# Altium footprint library 7-Connectors-13.PcbLib: 44 footprints (part 1 of 5) (continued)
## 3M_N3428-5302RB [mm] "3M, 3000 Series, 20 Contacts - Pitch 2.54mm - Right Angle Four-Wall Header (Black) With Long Roll Pin Latch/Ejectors" (continued)
Mechanical 14:
  circle w0.1: c-17.018,6.375 r0.787
  circle w0.1: c17.018,6.375 r0.787
  circle w0.1: c17.336,0.533 r1.27
  circle w0.1: c-17.336,0.533 r1.27
  lines w0.1: -19.837,-2.007 -19.837,1.978 -17.336,3.422 -14.834,1.978 -14.834,-2.007 ; -18.339,14.249 -18.339,24.561 -18.186,24.649 -13.081,21.702 -13.081,18.336 -13.183,18.235 -18.339,18.235 ; -15.113,14.757 -15.113,22.875 ; -12.694,11.201 -11.424,9.002 -10.887,9.931 ; -11.119,11.201 -11.119,9.931 -9.201,9.931 -9.208,11.201 ; -2.032,5.105 2.032,5.105 ; -2.032,11.201 -2.032,3.581 2.032,3.581 2.032,11.201 ; -1.587,5.105 -1.587,11.201 ; -0.953,5.105 -0.953,11.201 ; 0.953,5.105 0.953,11.201 ; 1.587,5.105 1.587,11.201 ; 6.668,11.201 6.661,9.931 8.579,9.931 8.573,11.201 ; 14.834,-2.007 14.834,1.978 17.336,3.422 19.837,1.978 19.837,-2.007 ; 15.113,22.875 15.137,14.757 ; 18.339,14.249 18.339,24.561 18.186,24.649 13.081,21.702 13.081,18.336 13.183,18.235 18.339,18.235 ; -22.352,-2.007 -22.352,5.105 -19.024,14.249 -18.182,14.249 ccw(c-17.018,14.757) -15.748,14.757 -14.906,14.757 -14.464,12.251 ccw(c-13.213,12.471) -13.213,11.201 13.213,11.201 ccw(c13.213,12.471) 14.464,12.251 14.906,14.757 15.748,14.757 ccw(c17.018,14.757) 18.182,14.249 19.024,14.249 22.352,5.105 22.352,-2.007 -22.352,-2.007
  text "1" at -13.462,-1.7 h1.02
  text "20" at 12.69,0.889 h1.02
3D body "3M_N3428-5302RB.stp": height 8.64, standoff -3.94, extent -22.352,-2.006 22.352,24.663
3D body "3M_N3428-5302RB.stp": height 0, standoff 0, extent 0,0 0,0
3D body "3M_N3428-5302RB.stp": height 0, standoff 0, extent 18.415,-7.62 18.415,-7.62

## 3M_N3429-5202RB [mm] "3M, 3000 Series, 26 Contacts - Pitch 2.54mm - Right Angle Four-Wall Header (Black) With Short Roll Pin Latch/Ejectors"
height 8.6
pads (28):
  round 1.6 hole 0.9: 1(-15.24,-1.27) 2(-15.24,1.27) 3(-12.7,-1.27) 4(-12.7,1.27) 5(-10.16,-1.27) 6(-10.16,1.27) 7(-7.62,-1.27) 8(-7.62,1.27) 9(-5.08,-1.27) 10(-5.08,1.27) 11(-2.54,-1.27) 12(-2.54,1.27) 13(0,-1.27) 14(0,1.27) 15(2.54,-1.27) 16(2.54,1.27) 17(5.08,-1.27) 18(5.08,1.27) 19(7.62,-1.27) 20(7.62,1.27) 21(10.16,-1.27) 22(10.16,1.27) 23(12.7,-1.27) 24(12.7,1.27) 25(15.24,-1.27) 26(15.24,1.27)
  round 4.6 hole 2.8: MTG1(-21.146,0.533) MTG2(21.146,0.533)
Top Overlay:
  circle w0.3: c-15.313,-3.048 r0.15
  lines w0.2: -29.561,9.892 -26.983,14.358 ccw(c-27.071,14.409) -27.02,14.497 -29.935,16.179 -35.04,13.232 ccw(c-34.989,13.144) -35.04,13.056 -28.051,9.02 -25.74,6.266 ; -27.948,12.686 -24.192,10.517 ; -24.702,-2.009 -26.162,-2.007 -26.162,5.105 -22.834,14.249 -21.992,14.249 ccw(c-20.828,14.757) -19.558,14.756 -18.716,14.757 -18.274,12.251 ccw(c-17.023,12.471) -17.023,11.201 17.023,11.201 ccw(c17.023,12.471) 18.274,12.251 18.716,14.757 19.558,14.757 ccw(c20.828,14.757) 21.992,14.249 22.834,14.249 26.162,5.105 26.162,-2.007 24.702,-2.007 cw(c24.194,-2.007) 23.686,-2.007 ; -24.702,-2.007 ccw(c-24.194,-2.007) -23.686,-2.007 ; -22.149,14.249 -22.149,22.024 cw(c-22.047,22.024) -21.996,22.112 -16.891,19.164 -16.891,15.799 cw(c-16.993,15.799) -16.993,15.697 -22.149,15.697 ; -18.923,14.757 -18.923,15.697 ; -16.478,11.201 -15.208,9.002 -14.671,9.931 ; -14.929,11.201 -14.929,9.931 -13.011,9.931 -13.011,11.201 ; -6.858,-2.007 ccw(c-6.35,-2.007) -5.842,-2.007 ; -2.032,11.201 -2.032,3.581 2.032,3.581 2.032,11.201 ; 5.842,-2.007 ccw(c6.35,-2.007) 6.858,-2.007 ; 18.923,14.757 18.923,15.697 ; 22.149,14.249 22.149,22.024 ccw(c22.047,22.024) 21.996,22.112 16.891,19.164 16.891,15.799 ccw(c16.993,15.799) 16.993,15.697 22.149,15.697 ; 24.192,10.517 27.948,12.686 ; 25.74,6.266 28.051,9.02 35.04,13.056 ccw(c34.989,13.144) 35.04,13.232 29.935,16.179 27.02,14.497 ccw(c27.071,14.409) 26.983,14.358 29.561,9.892
  text "1" at -17.272,-1.7 h1.02
  text "26" at 16.5,0.889 h1.02
Mechanical 8:
  circle w0.05: c15.24,1.27 r0.5
  circle w0.05: c12.7,1.27 r0.5
  circle w0.05: c10.16,1.27 r0.5
  circle w0.05: c7.62,1.27 r0.5
  circle w0.05: c5.08,1.27 r0.5
  circle w0.05: c2.54,1.27 r0.5
  circle w0.05: c0,1.27 r0.5
  circle w0.05: c-2.54,1.27 r0.5
  circle w0.05: c-5.08,1.27 r0.5
  circle w0.05: c-7.62,1.27 r0.5
  circle w0.05: c-10.16,1.27 r0.5
  circle w0.05: c-12.7,1.27 r0.5
  circle w0.05: c-15.24,1.27 r0.5
  circle w0.05: c-15.24,-1.27 r0.5
  circle w0.05: c-12.7,-1.27 r0.5
  circle w0.05: c-10.16,-1.27 r0.5
  circle w0.05: c-7.62,-1.27 r0.5
  circle w0.05: c-5.08,-1.27 r0.5
  circle w0.05: c-2.54,-1.27 r0.5
  circle w0.05: c0,-1.27 r0.5
  circle w0.05: c2.54,-1.27 r0.5
  circle w0.05: c5.08,-1.27 r0.5
  circle w0.05: c7.62,-1.27 r0.5
  circle w0.05: c10.16,-1.27 r0.5
  circle w0.05: c12.7,-1.27 r0.5
  circle w0.05: c15.24,-1.27 r0.5
  circle w0.1: c21.146,0.533 r1.3
  circle w0.05: c-21.146,0.533 r1.3
  lines w0.05: -1,0 0,0 0,-1
Mechanical 14:
  lines w0.1: -29.561,9.892 -26.983,14.358 ccw(c-27.071,14.409) -27.02,14.497 -29.935,16.179 -35.04,13.232 ccw(c-34.989,13.144) -35.04,13.056 -28.051,9.02 -25.74,6.266 ; -27.948,12.686 -24.192,10.517 ; -24.702,-2.009 -26.162,-2.007 -26.162,5.105 -22.834,14.249 -21.992,14.249 ccw(c-20.828,14.757) -19.558,14.756 -18.716,14.757 -18.274,12.251 ccw(c-17.023,12.471) -17.023,11.201 17.023,11.201 ccw(c17.023,12.471) 18.274,12.251 18.716,14.757 19.558,14.757 ccw(c20.828,14.757) 21.992,14.249 22.834,14.249 26.162,5.105 26.162,-2.007 24.702,-2.007 cw(c24.194,-2.007) 23.686,-2.007 6.858,-2.007 cw(c6.35,-2.007) 5.842,-2.007 -5.842,-2.007 cw(c-6.35,-2.007) -6.858,-2.007 -23.686,-2.007 cw(c-24.194,-2.007) -24.702,-2.007 ; -23.647,-2.007 -23.647,1.978 -21.146,3.422 -18.644,1.978 -18.644,-2.007 ; -23.28,-2.007 -23.043,0.699 cw(c-21.146,0.533) -19.248,0.699 -19.011,-2.007 ; -22.149,14.249 -22.149,22.024 cw(c-22.047,22.024) -21.996,22.112 -16.891,19.164 -16.891,15.799 cw(c-16.993,15.799) -16.993,15.697 -22.149,15.697 ; -18.923,14.757 -18.923,15.697 ; -16.478,11.201 -15.208,9.002 -14.671,9.931 ; -14.929,11.201 -14.929,9.931 -13.011,9.931 -13.011,11.201 ; -2.032,11.201 -2.032,3.581 2.032,3.581 2.032,11.201 ; 18.644,-2.007 18.644,1.978 21.146,3.422 23.647,1.978 23.647,-2.007 ; 18.923,14.757 18.923,15.697 ; 19.011,-2.007 19.248,0.699 cw(c21.146,0.533) 23.043,0.699 23.28,-2.007 ; 22.149,14.249 22.149,22.024 ccw(c22.047,22.024) 21.996,22.112 16.891,19.164 16.891,15.799 ccw(c16.993,15.799) 16.993,15.697 22.149,15.697 ; 24.192,10.517 27.948,12.686 ; 25.74,6.266 28.051,9.02 35.04,13.056 ccw(c34.989,13.144) 35.04,13.232 29.935,16.179 27.02,14.497 ccw(c27.071,14.409) 26.983,14.358 29.561,9.892
  text "1" at -17.272,-1.7 h1.02
  text "26" at 16.5,0.889 h1.02
3D body "3M_N3429-5202RB.stp": height 8.64, standoff -3.94, extent -35.091,-2.513 35.091,16.181

## 3M_N3429-5302RB [mm] "3M, 3000 Series, 26 Contacts - Pitch 2.54mm - Right Angle Four-Wall Header (Black) With Long Roll Pin Latch/Ejectors"
height 8.6
pads (28):
  round 1.6 hole 0.9: 1(-15.24,-1.27) 2(-15.24,1.27) 3(-12.7,-1.27) 4(-12.7,1.27) 5(-10.16,-1.27) 6(-10.16,1.27) 7(-7.62,-1.27) 8(-7.62,1.27) 9(-5.08,-1.27) 10(-5.08,1.27) 11(-2.54,-1.27) 12(-2.54,1.27) 13(0,-1.27) 14(0,1.27) 15(2.54,-1.27) 16(2.54,1.27) 17(5.08,-1.27) 18(5.08,1.27) 19(7.62,-1.27) 20(7.62,1.27) 21(10.16,-1.27) 22(10.16,1.27) 23(12.7,-1.27) 24(12.7,1.27) 25(15.24,-1.27) 26(15.24,1.27)
  round 4.6 hole 2.8: MTG1(-21.146,0.533) MTG2(21.146,0.533)
Top Overlay:
  circle w0.3: c-15.313,-3.048 r0.15
  lines w0.2: -31.759,11.161 -29.181,15.627 ccw(c-29.269,15.677) -29.218,15.765 -32.132,17.448 -37.238,14.5 ccw(c-37.187,14.412) -37.238,14.324 -28.051,9.02 -25.74,6.266 ; -30.146,13.955 -24.192,10.517 ; -23.686,-2.007 cw(c-24.194,-2.007) -24.702,-2.007 -26.162,-2.007 -26.162,5.105 -22.834,14.249 -21.992,14.249 ccw(c-20.828,14.757) -19.558,14.756 -18.716,14.757 -18.274,12.251 ccw(c-17.023,12.471) -17.023,11.201 17.023,11.201 ccw(c17.023,12.471) 18.274,12.251 18.716,14.757 19.558,14.757 ccw(c20.828,14.757) 21.992,14.249 22.834,14.249 26.162,5.105 26.162,-2.007 24.702,-2.007 cw(c24.194,-2.007) 23.686,-2.007 ; -22.149,14.249 -22.149,24.561 cw(c-22.047,24.561) -21.996,24.649 -16.891,21.702 -16.891,18.336 cw(c-16.993,18.336) -16.993,18.235 -22.149,18.235 ; -18.923,14.757 -18.923,18.235 ; -16.478,11.201 -15.208,9.002 -14.671,9.931 ; -14.929,11.201 -14.929,9.931 -13.011,9.931 -13.011,11.201 ; -6.858,-2.007 ccw(c-6.35,-2.007) -5.842,-2.007 ; -2.032,11.201 -2.032,3.581 2.032,3.581 2.032,11.201 ; 5.842,-2.007 ccw(c6.35,-2.007) 6.858,-2.007 ; 18.923,14.757 18.923,18.235 ; 22.149,14.249 22.149,24.561 ccw(c22.047,24.561) 21.996,24.649 16.891,21.702 16.891,18.336 ccw(c16.993,18.336) 16.993,18.235 22.149,18.235 ; 24.192,10.517 30.146,13.955 ; 25.74,6.266 28.051,9.02 37.238,14.324 ccw(c37.187,14.412) 37.238,14.5 32.132,17.448 29.218,15.765 ccw(c29.269,15.677) 29.181,15.627 31.759,11.161
  text "26" at 16.5,0.889 h1.02
  text "1" at -17.272,-1.7 h1.02
Mechanical 8:
  circle w0.05: c-21.146,0.533 r1.3
  circle w0.1: c21.146,0.533 r1.3
  circle w0.05: c15.24,-1.27 r0.5
  circle w0.05: c12.7,-1.27 r0.5
  circle w0.05: c10.16,-1.27 r0.5
  circle w0.05: c7.62,-1.27 r0.5
  circle w0.05: c5.08,-1.27 r0.5
  circle w0.05: c2.54,-1.27 r0.5
  circle w0.05: c0,-1.27 r0.5
  circle w0.05: c-2.54,-1.27 r0.5
  circle w0.05: c-5.08,-1.27 r0.5
  circle w0.05: c-7.62,-1.27 r0.5
  circle w0.05: c-10.16,-1.27 r0.5
  circle w0.05: c-12.7,-1.27 r0.5
  circle w0.05: c-15.24,-1.27 r0.5
  circle w0.05: c-15.24,1.27 r0.5
  circle w0.05: c-12.7,1.27 r0.5
  circle w0.05: c-10.16,1.27 r0.5
  circle w0.05: c-7.62,1.27 r0.5
  circle w0.05: c-5.08,1.27 r0.5
  circle w0.05: c-2.54,1.27 r0.5
  circle w0.05: c0,1.27 r0.5
  circle w0.05: c2.54,1.27 r0.5
  circle w0.05: c5.08,1.27 r0.5
  circle w0.05: c7.62,1.27 r0.5
  circle w0.05: c10.16,1.27 r0.5
  circle w0.05: c12.7,1.27 r0.5
  circle w0.05: c15.24,1.27 r0.5
  lines w0.05: 0,0 0,-1 0,0 ; 0,0 -1,0 0,0
Mechanical 14:
  lines w0.1: -31.759,11.161 -29.181,15.627 ccw(c-29.269,15.677) -29.218,15.765 -32.132,17.448 -37.238,14.5 ccw(c-37.187,14.412) -37.238,14.324 -28.051,9.02 -25.74,6.266 ; -30.146,13.955 -24.192,10.517 ; -23.647,-2.007 -23.647,1.978 -21.146,3.422 -18.644,1.978 -18.644,-2.007 ; -23.28,-2.007 -23.043,0.699 cw(c-21.146,0.533) -19.248,0.699 -19.011,-2.007 ; -22.149,14.249 -22.149,24.561 cw(c-22.047,24.561) -21.996,24.649 -16.891,21.702 -16.891,18.336 cw(c-16.993,18.336) -16.993,18.235 -22.149,18.235 ; -18.923,14.757 -18.923,18.235 ; -16.478,11.201 -15.208,9.002 -14.671,9.931 ; -14.929,11.201 -14.929,9.931 -13.011,9.931 -13.011,11.201 ; -2.032,11.201 -2.032,3.581 2.032,3.581 2.032,11.201 ; 18.644,-2.007 18.644,1.978 21.146,3.422 23.647,1.978 23.647,-2.007 ; 18.923,14.757 18.923,18.235 ; 19.011,-2.007 19.248,0.699 cw(c21.146,0.533) 23.043,0.699 23.28,-2.007 ; 22.149,14.249 22.149,24.561 ccw(c22.047,24.561) 21.996,24.649 16.891,21.702 16.891,18.336 ccw(c16.993,18.336) 16.993,18.235 22.149,18.235 ; 24.192,10.517 30.146,13.955 ; 25.74,6.266 28.051,9.02 37.238,14.324 ccw(c37.187,14.412) 37.238,14.5 32.132,17.448 29.218,15.765 ccw(c29.269,15.677) 29.181,15.627 31.759,11.161 ; -26.162,-2.007 -26.162,5.105 -22.834,14.249 -21.992,14.249 ccw(c-20.828,14.757) -19.558,14.756 -18.716,14.757 -18.274,12.251 ccw(c-17.023,12.471) -17.023,11.201 17.023,11.201 ccw(c17.023,12.471) 18.274,12.251 18.716,14.757 19.558,14.757 ccw(c20.828,14.757) 21.992,14.249 22.834,14.249 26.162,5.105 26.162,-2.007 24.702,-2.007 cw(c24.194,-2.007) 23.686,-2.007 6.858,-2.007 cw(c6.35,-2.007) 5.842,-2.007 -5.842,-2.007 cw(c-6.35,-2.007) -6.858,-2.007 -23.686,-2.007 cw(c-24.194,-2.007) -24.702,-2.007 -26.162,-2.007
  text "26" at 16.5,0.889 h1.02
  text "1" at -17.272,-1.7 h1.02
3D body "3M_N3429-5302RB.stp": height 8.64, standoff -3.94, extent -37.288,-2.514 37.289,17.448

## 3M_N3429-D002RB [mm] "3M, 3000 Series, 2x26 Contacts - Pitch 2.54mm - Right Angle Four-Wall Condo Header (Black) Without Latch/Ejectors"
height 15.5
pads (54):
  round 1.7 hole 1: 1L(-15.24,1.27) 1U(-15.24,-3.81) 2L(-15.24,3.81) 2U(-15.24,-1.27) 3L(-12.7,1.27) 3U(-12.7,-3.81) 4L(-12.7,3.81) 4U(-12.7,-1.27) 5L(-10.16,1.27) 5U(-10.16,-3.81) 6L(-10.16,3.81) 6U(-10.16,-1.27) 7L(-7.62,1.27) 7U(-7.62,-3.81) 8L(-7.62,3.81) 8U(-7.62,-1.27) 9L(-5.08,1.27) 9U(-5.08,-3.81) 10L(-5.08,3.81) 10U(-5.08,-1.27) 11L(-2.54,1.27) 11U(-2.54,-3.81) 12L(-2.54,3.81) 12U(-2.54,-1.27) 13L(0,1.27) 13U(0,-3.81) 14L(0,3.81) 14U(0,-1.27) 15L(2.54,1.27) 15U(2.54,-3.81) 16L(2.54,3.81) 16U(2.54,-1.27) 17L(5.08,1.27) 17U(5.08,-3.81) 18L(5.08,3.81) 18U(5.08,-1.27) 19L(7.62,1.27) 19U(7.62,-3.81) 20L(7.62,3.81) 20U(7.62,-1.27) 21L(10.16,1.27) 21U(10.16,-3.81) 22L(10.16,3.81) 22U(10.16,-1.27) 23L(12.7,1.27) 23U(12.7,-3.81) 24L(12.7,3.81) 24U(12.7,-1.27) 25L(15.24,1.27) 25U(15.24,-3.81) 26L(15.24,3.81) 26U(15.24,-1.27)
  round 4.6 hole 2.6: MTG1(-21.146,3.073) MTG2(21.146,3.073)
Top Overlay:
  circle w0.2: c-20.828,8.915 r0.953
  circle w0.2: c20.828,8.915 r0.953
  circle w0.2: c20.828,8.915 r0.953
  circle w0.2: c-20.828,8.915 r0.953
  circle w0.2: c-20.828,8.915 r0.953
  circle w0.3: c-15.313,-5.913 r0.15
  lines w0.2: -26.162,0.533 -24.702,0.533 ; -16.478,13.741 -15.208,11.542 -14.671,12.471 ; -2.032,7.645 2.032,7.645 ; 24.702,0.533 26.162,0.533 ; -26.162,-5.309 -26.162,7.645 -22.834,16.789 -21.992,16.789 ccw(c-20.828,17.297) -19.558,17.297 -18.716,17.297 -18.286,14.859 ccw(c-16.989,15.053) -16.954,13.741 -14.929,13.741 -14.929,12.471 -13.011,12.471 -13.011,13.741 -2.032,13.741 -2.032,6.121 2.032,6.121 2.032,13.741 10.471,13.741 10.471,12.471 12.389,12.471 12.389,13.741 16.954,13.741 ccw(c16.989,15.053) 18.286,14.859 18.716,17.297 19.558,17.297 ccw(c20.828,17.297) 21.992,16.789 22.834,16.789 26.162,7.645 26.162,-5.309 -26.162,-5.309
  text "26" at 16.5,-1.651 h1.02
  text "LOWER" at -16.125,5.475 h1
  text "UPPER" at -22.75,-4.25 h1
  text "1" at -17.272,-4.24 h1.02
  text "1" at -17.272,0.84 h1.02
  text "26" at 16.5,3.429 h1.02
Mechanical 8:
  drawing of 245 lines, arcs and shapes, not listed
Mechanical 14:
  circle w0.1: c-21.146,3.073 r1.27
  circle w0.1: c21.146,3.073 r1.27
  circle w0.1: c-20.828,8.915 r0.953
  circle w0.1: c20.828,8.915 r0.953
  lines w0.1: -26.162,0.533 -24.702,0.533 ccw(c-24.194,0.533) -23.686,0.533 -23.647,0.533 -23.647,4.518 -21.146,5.962 -18.644,4.518 -18.644,0.533 18.644,0.533 18.644,4.518 21.146,5.962 23.647,4.518 23.647,0.533 23.686,0.533 ccw(c24.194,0.533) 24.702,0.533 26.162,0.533 ; -16.478,13.741 -15.208,11.542 -14.671,12.471 ; -6.858,0.533 ccw(c-6.35,0.533) -5.842,0.533 ; -2.032,7.645 2.032,7.645 ; 5.842,0.533 ccw(c6.35,0.533) 6.858,0.533 ; -26.162,-5.309 -26.162,7.645 -22.834,16.789 -21.992,16.789 ccw(c-20.828,17.297) -19.558,17.297 -18.716,17.297 -18.286,14.859 ccw(c-16.989,15.053) -16.954,13.741 -14.929,13.741 -14.929,12.471 -13.011,12.471 -13.011,13.741 -2.032,13.741 -2.032,6.121 2.032,6.121 2.032,13.741 10.471,13.741 10.471,12.471 12.389,12.471 12.389,13.741 16.954,13.741 ccw(c16.989,15.053) 18.286,14.859 18.716,17.297 19.558,17.297 ccw(c20.828,17.297) 21.992,16.789 22.834,16.789 26.162,7.645 26.162,-5.309 -26.162,-5.309
  text "26" at 16.5,-1.651 h1.02
  text "LOWER" at -16.125,5.475 h1
  text "UPPER" at -22.75,-4.25 h1
  text "1" at -17.272,-4.24 h1.02
  text "1" at -17.272,-4.24 h1.02
  text "1" at -17.272,0.84 h1.02
  text "26" at 16.5,3.429 h1.02
3D body "3M_N3429-D002RB.stp": height 15.49, standoff -3.81, extent -26.162,-5.309 26.162,17.297

## 3M_N3429-D202RB [mm] "3M, 3000 Series, 2x26 Contacts - Pitch 2.54mm - Right Angle Four-Wall Condo Header (Black) With Short Roll Pin Latch/Ejectors"
height 15.5
pads (54):
  round 1.7 hole 1: 1L(-15.24,1.27) 1U(-15.24,-3.81) 2L(-15.24,3.81) 2U(-15.24,-1.27) 3L(-12.7,1.27) 3U(-12.7,-3.81) 4L(-12.7,3.81) 4U(-12.7,-1.27) 5L(-10.16,1.27) 5U(-10.16,-3.81) 6L(-10.16,3.81) 6U(-10.16,-1.27) 7L(-7.62,1.27) 7U(-7.62,-3.81) 8L(-7.62,3.81) 8U(-7.62,-1.27) 9L(-5.08,1.27) 9U(-5.08,-3.81) 10L(-5.08,3.81) 10U(-5.08,-1.27) 11L(-2.54,1.27) 11U(-2.54,-3.81) 12L(-2.54,3.81) 12U(-2.54,-1.27) 13L(0,1.27) 13U(0,-3.81) 14L(-13.462,3.81) 14U(0,-1.27) 15L(2.54,1.27) 15U(2.54,-3.81) 16L(2.54,3.81) 16U(2.54,-1.27) 17L(5.08,1.27) 17U(5.08,-3.81) 18L(5.08,3.81) 18U(5.08,-1.27) 19L(7.62,1.27) 19U(7.62,-3.81) 20L(7.62,3.81) 20U(7.62,-1.27) 21L(10.16,1.27) 21U(10.16,-3.81) 22L(10.16,3.81) 22U(10.16,-1.27) 23L(12.7,1.27) 23U(12.7,-3.81) 24L(12.7,3.81) 24U(12.7,-1.27) 25L(15.24,1.27) 25U(15.24,-3.81) 26L(15.24,3.81) 26U(15.24,-1.27)
  round 4.6 hole 2.6: MTG1(-21.146,3.073) MTG2(21.146,3.073)
Top Overlay:
  circle w0.2: c-20.828,8.915 r0.953
  circle w0.2: c20.828,8.915 r0.953
  circle w0.2: c20.828,8.915 r0.953
  circle w0.2: c-20.828,8.915 r0.953
  circle w0.2: c-20.828,8.915 r0.953
  circle w0.3: c-15.313,-5.913 r0.15
  lines w0.2: -32.583,16.687 -24.319,12.71 ; -29.8,11.768 -27.52,16.505 -30.644,18.009 -35.66,14.588 -28.229,11.011 -25.831,8.554 ; -26.162,0.533 -24.702,0.533 ; -22.149,16.789 -22.149,24.74 -16.891,21.704 -16.891,18.237 -22.149,18.237 ; -18.923,17.297 -18.923,22.877 ; -16.478,13.741 -15.208,11.542 -14.671,12.471 ; -2.032,7.645 2.032,7.645 ; 18.923,17.297 18.923,22.877 ; 22.149,16.789 22.149,24.74 16.891,21.704 16.891,18.237 22.149,18.237 ; 24.319,12.71 32.583,16.687 ; 24.702,0.533 26.162,0.533 ; 25.831,8.554 28.229,11.011 35.66,14.588 30.644,18.009 27.52,16.505 29.8,11.768 ; -26.162,-5.309 -26.162,7.645 -22.834,16.789 -21.992,16.789 ccw(c-20.828,17.297) -19.558,17.297 -18.716,17.297 -18.286,14.859 ccw(c-16.989,15.053) -16.954,13.741 -14.929,13.741 -14.929,12.471 -13.011,12.471 -13.011,13.741 -2.032,13.741 -2.032,6.121 2.032,6.121 2.032,13.741 10.471,13.741 10.471,12.471 12.389,12.471 12.389,13.741 16.954,13.741 ccw(c16.989,15.053) 18.286,14.859 18.716,17.297 19.558,17.297 ccw(c20.828,17.297) 21.992,16.789 22.834,16.789 26.162,7.645 26.162,-5.309 -26.162,-5.309
  text "26" at 16.5,-1.651 h1.02
  text "LOWER" at -16.125,5.475 h1
  text "UPPER" at -22.75,-4.25 h1
  text "1" at -17.272,-4.24 h1.02
  text "1" at -17.272,0.84 h1.02
  text "26" at 16.5,3.429 h1.02
Mechanical 8:
  drawing of 245 lines, arcs and shapes, not listed
Mechanical 14:
  circle w0.1: c-21.146,3.073 r1.27
  circle w0.1: c21.146,3.073 r1.27
  circle w0.1: c-20.828,8.915 r0.953
  circle w0.1: c20.828,8.915 r0.953
  lines w0.1: -32.583,16.687 -24.319,12.71 ; -29.8,11.768 -27.52,16.505 -30.644,18.009 -35.66,14.588 -28.229,11.011 -25.831,8.554 ; -26.162,0.533 -24.702,0.533 ccw(c-24.194,0.533) -23.686,0.533 -23.647,0.533 -23.647,4.518 -21.146,5.962 -18.644,4.518 -18.644,0.533 18.644,0.533 18.644,4.518 21.146,5.962 23.647,4.518 23.647,0.533 23.686,0.533 ccw(c24.194,0.533) 24.702,0.533 26.162,0.533 ; -22.149,16.789 -22.149,24.74 -16.891,21.704 -16.891,18.237 -22.149,18.237 ; -18.923,17.297 -18.923,22.877 ; -16.478,13.741 -15.208,11.542 -14.671,12.471 ; -6.858,0.533 ccw(c-6.35,0.533) -5.842,0.533 ; -2.032,7.645 2.032,7.645 ; 5.842,0.533 ccw(c6.35,0.533) 6.858,0.533 ; 18.923,17.297 18.923,22.877 ; 22.149,16.789 22.149,24.74 16.891,21.704 16.891,18.237 22.149,18.237 ; 24.319,12.71 32.583,16.687 ; 25.831,8.554 28.229,11.011 35.66,14.588 30.644,18.009 27.52,16.505 29.8,11.768 ; -26.162,-5.309 -26.162,7.645 -22.834,16.789 -21.992,16.789 ccw(c-20.828,17.297) -19.558,17.297 -18.716,17.297 -18.286,14.859 ccw(c-16.989,15.053) -16.954,13.741 -14.929,13.741 -14.929,12.471 -13.011,12.471 -13.011,13.741 -2.032,13.741 -2.032,6.121 2.032,6.121 2.032,13.741 10.471,13.741 10.471,12.471 12.389,12.471 12.389,13.741 16.954,13.741 ccw(c16.989,15.053) 18.286,14.859 18.716,17.297 19.558,17.297 ccw(c20.828,17.297) 21.992,16.789 22.834,16.789 26.162,7.645 26.162,-5.309 -26.162,-5.309
  text "26" at 16.5,-1.651 h1.02
  text "LOWER" at -16.125,5.475 h1
  text "UPPER" at -22.75,-4.25 h1
  text "1" at -17.272,-4.24 h1.02
  text "1" at -17.272,-4.24 h1.02
  text "1" at -17.272,0.84 h1.02
  text "26" at 16.5,3.429 h1.02
3D body "3M_N3429-D202RB.stp": height 15.49, standoff -3.81, extent -35.558,-5.309 35.558,18.009

## 3M_N3431-5302RB [mm] "3M, 3000 Series, 34 Contacts - Pitch 2.54mm - Right Angle Four-Wall Header (Black) With Long Roll Pin Latch/Ejectors"
height 24.6
pads (36):
  round 1.6 hole 0.9: 1(-20.32,-1.27) 2(-20.32,1.27) 3(-17.78,-1.27) 4(-17.78,1.27) 5(-15.24,-1.27) 6(-15.24,1.27) 7(-12.7,-1.27) 8(-12.7,1.27) 9(-10.16,-1.27) 10(-10.16,1.27) 11(-7.62,-1.27) 12(-7.62,1.27) 13(-5.08,-1.27) 14(-5.08,1.27) 15(-2.54,-1.27) 16(-2.54,1.27) 17(0,-1.27) 18(0,1.27) 19(2.54,-1.27) 20(2.54,1.27) 21(5.08,-1.27) 22(5.08,1.27) 23(7.62,-1.27) 24(7.62,1.27) 25(10.16,-1.27) 26(10.16,1.27) 27(12.7,-1.27) 28(12.7,1.27) 29(15.24,-1.27) 30(15.24,1.27) 31(17.78,-1.27) 32(17.78,1.27) 33(20.32,-1.27) 34(20.32,1.27)
  round 4.6 hole 2.8: MTG1(-26.226,0.533) MTG2(26.232,0.533)
Top Overlay:
  circle w0.2: c-25.908,6.375 r0.787
  circle w0.2: c-20.393,-3.048 r0.15
  circle w0.2: c25.908,6.375 r0.787
  lines w0.2: -28.13,-2.007 -31.242,-2.007 -31.242,5.105 -27.914,14.249 -27.072,14.249 ccw(c-25.908,14.757) -24.638,14.757 -23.796,14.757 -23.354,12.251 ccw(c-22.103,12.471) -22.103,11.201 22.103,11.201 ccw(c22.103,12.471) 23.354,12.251 23.796,14.757 24.638,14.757 ccw(c25.908,14.757) 27.072,14.249 27.914,14.249 31.242,5.105 31.242,-2.007 28.13,-2.007 ; -27.229,14.249 -27.229,24.561 -27.076,24.649 -21.971,21.702 -21.971,18.336 -22.073,18.235 -27.229,18.235 ; -24.003,14.757 -24.003,22.875 ; -21.584,11.201 -20.314,9.002 -19.777,9.931 ; -20.009,11.201 -20.009,9.931 -18.091,9.931 -18.098,11.201 ; -2.032,5.105 2.032,5.105 ; -2.032,11.201 -2.032,3.581 2.032,3.581 2.032,11.201 ; -1.581,5.105 -1.581,11.201 ; -0.946,5.105 -0.946,11.201 ; 0.959,5.105 0.959,11.201 ; 1.594,5.105 1.594,11.201 ; 24.027,14.757 24.027,22.875 ; 27.229,14.249 27.229,24.561 27.076,24.649 21.971,21.702 21.971,18.336 22.073,18.235 27.229,18.235
  text "34" at 19.685,2.667 h1.02
  text "1" at -22.352,-1.7 h1.02
Mechanical 14:
  circle w0.1: c-25.908,6.375 r0.787
  circle w0.1: c-26.226,0.533 r1.27
  circle w0.1: c25.908,6.375 r0.787
  circle w0.1: c26.226,0.533 r1.27
  lines w0.1: -28.727,-2.007 -28.727,1.978 -26.226,3.422 -23.724,1.978 -23.724,-2.007 ; -27.229,14.249 -27.229,24.561 -27.076,24.649 -21.971,21.702 -21.971,18.336 -22.073,18.235 -27.229,18.235 ; -24.003,14.757 -24.003,22.875 ; -21.584,11.201 -20.314,9.002 -19.777,9.931 ; -20.009,11.201 -20.009,9.931 -18.091,9.931 -18.098,11.201 ; -2.032,5.105 2.032,5.105 ; -2.032,11.201 -2.032,3.581 2.032,3.581 2.032,11.201 ; -1.581,5.105 -1.581,11.201 ; -0.946,5.105 -0.946,11.201 ; 0.959,5.105 0.959,11.201 ; 1.594,5.105 1.594,11.201 ; 23.724,-2.007 23.724,1.978 26.226,3.422 28.727,1.978 28.727,-2.007 ; 24.027,14.757 24.027,22.875 ; 27.229,14.249 27.229,24.561 27.076,24.649 21.971,21.702 21.971,18.336 22.073,18.235 27.229,18.235 ; -31.242,-2.007 31.242,-2.007 31.242,5.105 27.914,14.249 27.072,14.249 cw(c25.908,14.757) 24.638,14.757 23.796,14.757 23.354,12.251 cw(c22.103,12.471) 22.103,11.201 -22.103,11.201 cw(c-22.103,12.471) -23.354,12.251 -23.796,14.757 -24.638,14.757 cw(c-25.908,14.757) -27.072,14.249 -27.914,14.249 -31.242,5.105 -31.242,-2.007
  text "34" at 19.685,2.667 h1.02
  text "1" at -22.352,-1.7 h1.02
3D body "3M_N3431-5302RB.stp": height 8.64, standoff -3.94, extent -31.307,-2.514 31.307,24.663